# Altium footprint library Generic Footprint.PcbLib: 160 footprints (part 16 of 20) (continued)
## Symbol_FCC-Logo-6x4mm_Silkscreen [mil] (continued)
1(102.68,67.39) 1(102.68,68.46) 1(102.68,68.73) 1(102.68,68.99) 1(102.68,69.26) 1(102.68,69.53) 1(102.68,94.7) 1(102.68,94.96) 1(102.68,95.23) 1(102.68,95.5) 1(102.68,97.11) 1(102.68,97.37) 1(102.68,97.64) 1(102.68,98.18) 1(102.68,98.44) 1(102.68,138.07) 1(102.68,138.33) 1(102.68,138.6) 1(102.95,25.36) 1(102.95,25.89) 1(102.95,26.16) 1(102.95,65.25) 1(102.95,67.39) 1(102.95,67.66) 1(102.95,67.92) 1(102.95,68.19) 1(102.95,95.77) 1(102.95,96.03) 1(102.95,96.3) 1(102.95,96.57) 1(102.95,96.84) 1(102.95,97.11) 1(102.95,97.91) 1(102.95,98.71) 1(102.95,98.98) 1(102.95,137.8) 1(102.95,138.33) 1(103.22,25.09) 1(103.22,25.62) 1(103.22,25.89) 1(103.22,64.18) 1(103.22,64.44) 1(103.22,64.71) 1(103.22,64.98) 1(103.22,65.25) 1(103.22,65.51) 1(103.22,65.78) 1(103.22,66.05) 1(103.22,66.32) 1(103.22,66.59) 1(103.22,66.85) 1(103.22,67.12) 1(103.22,97.37) 1(103.22,97.64) 1(103.22,97.91) 1(103.22,98.18) 1(103.22,98.44) 1(103.22,98.71) 1(103.22,99.25) 1(103.22,99.51) 1(103.22,99.78) 1(103.22,138.07) 1(103.22,138.33) 1(103.22,138.6) 1(103.22,138.87) 1(103.49,25.36) 1(103.49,25.62) 1(103.49,63.64) 1(103.49,63.91) 1(103.49,64.44) 1(103.49,64.71) 1(103.49,64.98) 1(103.49,65.51) 1(103.49,65.78) 1(103.49,66.05) 1(103.49,97.91) 1(103.49,98.18) 1(103.49,98.44) 1(103.49,98.71) 1(103.49,99.25) 1(103.49,99.51) 1(103.49,100.05) 1(103.49,100.32) 1(103.49,100.59) 1(103.49,138.6) 1(103.49,138.87) 1(103.49,139.14) 1(103.75,24.82) 1(103.75,25.09) 1(103.75,25.36) 1(103.75,62.84) 1(103.75,63.11) 1(103.75,63.64) 1(103.75,63.91) 1(103.75,64.44) 1(103.75,64.71) 1(103.75,64.98) 1(103.75,99.25) 1(103.75,99.51) 1(103.75,100.05) 1(103.75,100.32) 1(103.75,100.59) 1(103.75,100.85) 1(103.75,101.12) 1(103.75,101.39) 1(103.75,101.66) 1(103.75,138.87) 1(103.75,139.4) 1(104.02,24.29) 1(104.02,24.55) 1(104.02,24.82) 1(104.02,25.09) 1(104.02,62.84) 1(104.02,63.11) 1(104.02,63.37) 1(104.02,63.64) 1(104.02,63.91) 1(104.02,100.05) 1(104.02,100.32) 1(104.02,100.59) 1(104.02,101.12) 1(104.02,101.39) 1(104.02,101.66) 1(104.02,139.67) 1(104.29,24.02) 1(104.29,24.82) 1(104.29,62.57) 1(104.29,62.84) 1(104.29,101.39) 1(104.29,139.94) 1(104.56,23.75) 1(104.56,24.29) 1(104.56,60.7) 1(104.56,63.11) 1(104.56,101.12) 1(104.56,101.66) 1(104.56,103.53) 1(104.56,140.21) 1(104.83,24.02) 1(104.83,24.29) 1(104.83,59.62) 1(104.83,59.89) 1(104.83,60.16) 1(104.83,60.7) 1(104.83,61.5) 1(104.83,61.77) 1(104.83,62.03) 1(104.83,62.3) 1(104.83,101.92) 1(104.83,102.19) 1(104.83,102.46) 1(104.83,103.53) 1(104.83,104.07) 1(104.83,104.33) 1(104.83,104.6) 1(104.83,140.21) 1(104.83,140.48) 1(105.09,23.48) 1(105.09,23.75) 1(105.09,24.02) 1(105.09,59.09) 1(105.09,59.62) 1(105.09,59.89) 1(105.09,60.16) 1(105.09,60.7) 1(105.09,60.96) 1(105.09,61.23) 1(105.09,102.73) 1(105.09,102.99) 1(105.09,103.26) 1(105.09,103.53) 1(105.09,104.07) 1(105.09,104.33) 1(105.09,104.6) 1(105.09,104.87) 1(105.09,105.14) 1(105.09,140.21) 1(105.09,140.48) 1(105.09,140.74) 1(105.36,22.95) 1(105.36,23.22) 1(105.36,23.48) 1(105.36,23.75) 1(105.36,58.29) 1(105.36,58.55) 1(105.36,58.82) 1(105.36,59.09) 1(105.36,59.62) 1(105.36,60.16) 1(105.36,60.43) 1(105.36,103.8) 1(105.36,104.07) 1(105.36,104.6) 1(105.36,104.87) 1(105.36,105.14) 1(105.36,105.4) 1(105.36,105.67) 1(105.36,140.48) 1(105.36,140.74) 1(105.36,141.01) 1(105.36,141.28) 1(105.63,23.22) 1(105.63,59.09) 1(105.63,59.36) 1(105.63,59.89) 1(105.63,104.33) 1(105.63,104.87) 1(105.63,105.94) 1(105.63,140.74) 1(105.9,22.95) 1(105.9,23.22) 1(105.9,23.48) 1(105.9,57.48) 1(105.9,57.75) 1(105.9,58.02) 1(105.9,58.55) 1(105.9,105.14) 1(105.9,105.67) 1(105.9,106.21) 1(105.9,106.48) 1(105.9,106.74) 1(105.9,141.55) 1(106.16,22.68) 1(106.16,57.22) 1(106.16,57.75) 1(106.16,58.55) 1(106.16,105.67) 1(106.16,106.48) 1(106.16,106.74) 1(106.16,107.01) 1(106.16,107.28) 1(106.16,141.81) 1(106.43,22.41) 1(106.43,22.68) 1(106.43,22.95) 1(106.43,56.68) 1(106.43,57.22) 1(106.43,57.75) 1(106.43,106.48) 1(106.43,106.74) 1(106.43,107.01) 1(106.43,107.28) 1(106.43,107.55) 1(106.7,22.14) 1(106.7,22.41) 1(106.7,22.68) 1(106.7,56.68) 1(106.7,56.95) 1(106.7,57.22) 1(106.7,107.01) 1(106.7,107.28) 1(106.7,107.55) 1(106.7,142.08) 1(106.97,21.88) 1(106.97,22.14) 1(106.97,22.41) 1(106.97,55.34) 1(106.97,56.14) 1(106.97,56.41) 1(106.97,56.68) 1(106.97,107.55) 1(106.97,108.88) 1(106.97,142.35) 1(107.24,21.34) 1(107.24,21.61) 1(107.24,21.88) 1(107.24,55.34) 1(107.24,107.81) 1(107.24,108.08) 1(107.24,108.88) 1(107.24,109.42) 1(107.24,109.69) 1(107.24,142.08) 1(107.24,142.35) 1(107.24,142.62) 1(107.5,21.07) 1(107.5,21.61) 1(107.5,21.88) 1(107.5,22.14) 1(107.5,54.27) 1(107.5,54.54) 1(107.5,55.34) 1(107.5,55.61) 1(107.5,55.88) 1(107.5,108.35) 1(107.5,108.62) 1(107.5,108.88) 1(107.5,109.42) 1(107.5,109.96) 1(107.5,110.22) 1(107.5,142.08) 1(107.5,142.35) 1(107.5,142.62) 1(107.5,142.88) 1(107.77,21.34) 1(107.77,21.61) 1(107.77,53.73) 1(107.77,54) 1(107.77,54.27) 1(107.77,54.54) 1(107.77,54.81) 1(107.77,55.07) 1(107.77,109.15) 1(107.77,109.42) 1(107.77,109.69) 1(107.77,109.96) 1(107.77,110.22) 1(107.77,110.49) 1(107.77,142.62) 1(107.77,142.88) 1(107.77,143.15) 1(108.04,20.81) 1(108.04,21.07) 1(108.04,21.34) 1(108.04,52.93) 1(108.04,53.2) 1(108.04,53.47) 1(108.04,53.73) 1(108.04,54) 1(108.04,54.27) 1(108.04,109.69) 1(108.04,109.96) 1(108.04,110.22) 1(108.04,110.49) 1(108.04,110.76) 1(108.04,111.03) 1(108.04,142.88) 1(108.04,143.42) 1(108.31,54) 1(108.31,54.54) 1(108.31,110.49) 1(108.31,110.76) 1(108.31,111.29) 1(108.31,143.15) 1(108.31,143.69) 1(108.57,20.54) 1(108.57,21.07) 1(108.57,52.4) 1(108.57,52.66) 1(108.57,53.2) 1(108.57,53.73) 1(108.57,110.76) 1(108.57,111.03) 1(108.57,111.56) 1(108.57,111.83) 1(108.57,143.15) 1(108.57,143.96) 1(108.84,20.27) 1(108.84,20.54) 1(108.84,20.81) 1(108.84,52.4) 1(108.84,53.2) 1(108.84,111.03) 1(108.84,111.56) 1(108.84,111.83) 1(108.84,112.1) 1(108.84,112.36) 1(109.11,20) 1(109.11,20.27) 1(109.11,20.81) 1(109.11,51.59) 1(109.11,52.4) 1(109.11,111.56) 1(109.11,111.83) 1(109.11,112.1) 1(109.11,112.36) 1(109.11,144.22) 1(109.38,19.73) 1(109.38,20) 1(109.38,20.27) 1(109.38,20.54) 1(109.38,51.59) 1(109.38,52.13) 1(109.38,112.1) 1(109.38,112.36) 1(109.38,144.22) 1(109.38,144.49) 1(109.64,19.47) 1(109.64,19.73) 1(109.64,50.52) 1(109.64,50.79) 1(109.64,51.86) 1(109.64,144.49) 1(109.64,144.76) 1(109.91,19.2) 1(109.91,20) 1(109.91,50.25) 1(109.91,50.79) 1(109.91,51.33) 1(109.91,51.59) 1(109.91,112.63) 1(109.91,112.9) 1(109.91,113.44) 1(109.91,113.7) 1(109.91,113.97) 1(109.91,144.22) 1(110.18,19.73) 1(110.18,49.72) 1(110.18,49.99) 1(110.18,50.25) 1(110.18,50.52) 1(110.18,50.79) 1(110.18,51.06) 1(110.18,113.17) 1(110.18,113.7) 1(110.18,113.97) 1(110.18,114.24) 1(110.18,114.51) 1(110.18,114.77) 1(110.45,18.66) 1(110.45,18.93) 1(110.45,19.2) 1(110.45,19.47) 1(110.45,49.18) 1(110.45,49.45) 1(110.45,49.72) 1(110.45,50.25) 1(110.45,50.52) 1(110.45,113.7) 1(110.45,113.97) 1(110.45,114.24) 1(110.45,114.51) 1(110.45,115.04) 1(110.45,144.49) 1(110.45,144.76) 1(110.45,145.29) 1(110.72,18.93) 1(110.72,19.2) 1(110.72,19.47) 1(110.72,48.92) 1(110.72,49.45) 1(110.72,49.72) 1(110.72,114.24) 1(110.72,114.51) 1(110.72,115.04) 1(110.72,115.31) 1(110.72,144.76) 1(110.72,145.03) 1(110.72,145.29) 1(110.72,145.56) 1(110.98,18.4) 1(110.98,18.66) 1(110.98,145.56) 1(110.98,145.83) 1(111.25,18.93) 1(111.25,48.92) 1(111.25,49.45) 1(111.25,115.04) 1(111.25,115.31) 1(111.25,145.29) 1(111.25,146.1) 1(111.52,18.13) 1(111.52,18.66) 1(111.52,48.92) 1(111.52,78.36) 1(111.52,78.63) 1(111.52,78.9) 1(111.52,79.17) 1(111.52,79.44) 1(111.52,79.7) 1(111.52,79.97) 1(111.52,80.24) 1(111.52,80.51) 1(111.52,80.77) 1(111.52,81.04) 1(111.52,81.31) 1(111.52,81.58) 1(111.52,81.85) 1(111.52,82.11) 1(111.52,82.38) 1(111.52,82.65) 1(111.52,82.92) 1(111.52,83.18) 1(111.52,83.45) 1(111.52,83.72) 1(111.52,83.99) 1(111.52,84.25) 1(111.52,84.52) 1(111.52,84.79) 1(111.52,85.06) 1(111.52,85.33) 1(111.52,85.59) 1(111.52,85.86) 1(111.52,115.31) 1(111.52,115.58) 1(111.52,115.85) 1(111.52,116.38) 1(111.52,145.56) 1(111.52,145.83) 1(111.79,17.86) 1(111.79,18.13) 1(111.79,18.4) 1(111.79,47.58) 1(111.79,48.11) 1(111.79,48.38) 1(111.79,48.65) 1(111.79,75.69) 1(111.79,75.96) 1(111.79,76.22) 1(111.79,76.49) 1(111.79,76.76) 1(111.79,77.03) 1(111.79,77.29) 1(111.79,77.56) 1(111.79,78.36) 1(111.79,78.63) 1(111.79,78.9) 1(111.79,79.17) 1(111.79,79.44) 1(111.79,79.7) 1(111.79,79.97) 1(111.79,80.24) 1(111.79,80.51) 1(111.79,80.77) 1(111.79,81.04) 1(111.79,81.31) 1(111.79,81.58) 1(111.79,81.85) 1(111.79,82.11) 1(111.79,82.38) 1(111.79,82.65) 1(111.79,82.92) 1(111.79,83.18) 1(111.79,83.45) 1(111.79,83.72) 1(111.79,83.99) 1(111.79,84.25) 1(111.79,84.52) 1(111.79,84.79) 1(111.79,85.06) 1(111.79,85.33) 1(111.79,85.59) 1(111.79,85.86) 1(111.79,86.66) 1(111.79,86.93) 1(111.79,87.2) 1(111.79,87.47) 1(111.79,87.74) 1(111.79,88) 1(111.79,88.27) 1(111.79,88.54) 1(111.79,116.38) 1(111.79,116.65) 1(111.79,145.83) 1(111.79,146.36) 1(112.05,17.33) 1(112.05,17.59) 1(112.05,17.86) 1(112.05,18.4) 1(112.05,47.58) 1(112.05,73.81) 1(112.05,74.08) 1(112.05,74.35) 1(112.05,74.62) 1(112.05,74.88) 1(112.05,75.69) 1(112.05,75.96) 1(112.05,76.22) 1(112.05,76.49) 1(112.05,76.76) 1(112.05,77.03) 1(112.05,77.29) 1(112.05,77.56) 1(112.05,78.1) 1(112.05,78.36) 1(112.05,78.63) 1(112.05,78.9) 1(112.05,79.17) 1(112.05,79.44) 1(112.05,79.7) 1(112.05,79.97) 1(112.05,80.24) 1(112.05,80.51) 1(112.05,80.77) 1(112.05,81.04) 1(112.05,81.31) 1(112.05,81.58) 1(112.05,81.85) 1(112.05,82.11) 1(112.05,82.38) 1(112.05,82.65) 1(112.05,82.92) 1(112.05,83.18) 1(112.05,83.45) 1(112.05,83.72) 1(112.05,83.99) 1(112.05,84.25) 1(112.05,84.52) 1(112.05,84.79) 1(112.05,85.06) 1(112.05,85.33) 1(112.05,85.59) 1(112.05,85.86) 1(112.05,86.13) 1(112.05,86.66) 1(112.05,86.93) 1(112.05,87.2) 1(112.05,87.47) 1(112.05,87.74) 1(112.05,88) 1(112.05,88.27) 1(112.05,88.54) 1(112.05,89.07) 1(112.05,89.34) 1(112.05,89.61) 1(112.05,89.88) 1(112.05,90.14) 1(112.05,90.41) 1(112.05,116.11) 1(112.05,116.65) 1(112.05,117.18) 1(112.05,146.63) 1(112.32,18.13) 1(112.32,47.04) 1(112.32,47.31) 1(112.32,47.58) 1(112.32,47.85) 1(112.32,72.21) 1(112.32,72.48) 1(112.32,72.74) 1(112.32,73.01) 1(112.32,73.28) 1(112.32,73.55) 1(112.32,73.81) 1(112.32,75.15) 1(112.32,77.83) 1(112.32,90.41) 1(112.32,90.68) 1(112.32,90.95) 1(112.32,91.22) 1(112.32,91.48) 1(112.32,91.75) 1(112.32,116.38) 1(112.32,116.65) 1(112.32,117.45) 1(112.32,146.63) 1(112.32,146.9) 1(112.59,17.86) 1(112.59,46.24) 1(112.59,46.51) 1(112.59,70.87) 1(112.59,71.14) 1(112.59,71.4) 1(112.59,71.67) 1(112.59,71.94) 1(112.59,74.08) 1(112.59,74.35) 1(112.59,74.62) 1(112.59,74.88) 1(112.59,75.15) 1(112.59,75.42) 1(112.59,75.69) 1(112.59,75.96) 1(112.59,76.22) 1(112.59,76.49) 1(112.59,76.76) 1(112.59,77.03) 1(112.59,77.29) 1(112.59,77.56) 1(112.59,86.4) 1(112.59,86.66) 1(112.59,86.93) 1(112.59,87.2) 1(112.59,87.47) 1(112.59,87.74) 1(112.59,88) 1(112.59,88.27) 1(112.59,88.54) 1(112.59,88.81) 1(112.59,89.07) 1(112.59,89.34) 1(112.59,89.61) 1(112.59,89.88) 1(112.59,90.14) 1(112.59,92.02) 1(112.59,92.29) 1(112.59,92.55) 1(112.59,92.82) 1(112.59,93.09) 1(112.59,93.36) 1(112.59,116.92) 1(112.59,117.18) 1(112.59,117.45) 1(112.59,117.72) 1(112.59,117.99) 1(112.59,147.17) 1(112.86,17.06) 1(112.86,45.97) 1(112.86,46.24) 1(112.86,46.51) 1(112.86,46.77) 1(112.86,69.8) 1(112.86,70.07) 1(112.86,70.33) 1(112.86,70.6) 1(112.86,72.48) 1(112.86,73.01) 1(112.86,73.81) 1(112.86,74.08) 1(112.86,74.35) 1(112.86,74.62) 1(112.86,74.88) 1(112.86,75.15) 1(112.86,89.07) 1(112.86,89.34) 1(112.86,89.61) 1(112.86,89.88) 1(112.86,90.14) 1(112.86,90.41) 1(112.86,91.22) 1(112.86,91.75) 1(112.86,93.62) 1(112.86,93.89) 1(112.86,94.16) 1(112.86,94.43) 1(112.86,117.18) 1(112.86,117.45) 1(112.86,117.99) 1(112.86,118.25) 1(113.12,16.79) 1(113.12,45.44) 1(113.12,45.7) 1(113.12,46.24) 1(113.12,46.51) 1(113.12,68.99) 1(113.12,69.26) 1(113.12,69.53) 1(113.12,69.8) 1(113.12,70.07) 1(113.12,72.48) 1(113.12,73.01) 1(113.12,91.22) 1(113.12,91.75) 1(113.12,93.89) 1(113.12,94.43) 1(113.12,94.7) 1(113.12,94.96) 1(113.12,95.23) 1(113.12,118.25) 1(113.12,118.52) 1(113.12,146.63) 1(113.12,146.9) 1(113.12,147.44) 1(113.39,16.52) 1(113.39,17.06) 1(113.39,45.7) 1(113.39,67.92) 1(113.39,68.99) 1(113.39,69.8) 1(113.39,70.07) 1(113.39,93.89) 1(113.39,94.43) 1(113.39,94.7) 1(113.39,94.96) 1(113.39,95.23) 1(113.39,95.5) 1(113.39,96.3) 1(113.39,117.99) 1(113.39,118.52) 1(113.39,118.79) 1(113.39,146.9) 1(113.39,147.17) 1(113.39,147.7) 1(113.66,45.17) 1(113.66,45.44) 1(113.66,45.7) 1(113.66,67.66) 1(113.66,68.19) 1(113.66,68.46) 1(113.66,95.5) 1(113.66,95.77) 1(113.66,96.03) 1(113.66,118.25) 1(113.66,118.79) 1(113.66,147.17) 1(113.66,147.44) 1(113.66,147.97) 1(113.93,16.25) 1(113.93,17.06) 1(113.93,45.17) 1(113.93,45.44) 1(113.93,66.85) 1(113.93,67.12) 1(113.93,67.39) 1(113.93,67.66) 1(113.93,67.92) 1(113.93,68.19) 1(113.93,68.46) 1(113.93,68.73) 1(113.93,68.99) 1(113.93,94.7) 1(113.93,94.96) 1(113.93,95.23) 1(113.93,95.5) 1(113.93,95.77) 1(113.93,96.03) 1(113.93,96.3) 1(113.93,96.84) 1(113.93,97.11) 1(113.93,97.37) 1(113.93,118.52) 1(114.2,15.99) 1(114.2,16.25) 1(114.2,16.52) 1(114.2,44.1) 1(114.2,44.36) 1(114.2,45.17) 1(114.2,65.51) 1(114.2,65.78) 1(114.2,66.05) 1(114.2,66.32) 1(114.2,66.85) 1(114.2,67.12) 1(114.2,67.66) 1(114.2,67.92) 1(114.2,68.19) 1(114.2,68.46) 1(114.2,95.77) 1(114.2,96.03) 1(114.2,96.3) 1(114.2,96.57) 1(114.2,96.84) 1(114.2,97.11) 1(114.2,97.37) 1(114.2,97.91) 1(114.2,98.18) 1(114.2,98.44) 1(114.2,118.79) 1(114.2,119.06) 1(114.2,119.86) 1(114.2,147.44) 1(114.2,148.24) 1(114.46,43.83) 1(114.46,44.36) 1(114.46,44.63) 1(114.46,44.9) 1(114.46,64.44) 1(114.46,65.25) 1(114.46,65.51) 1(114.46,65.78) 1(114.46,66.05) 1(114.46,66.32) 1(114.46,66.85) 1(114.46,67.12) 1(114.46,96.84) 1(114.46,97.11) 1(114.46,97.37) 1(114.46,97.91) 1(114.46,98.18) 1(114.46,98.44) 1(114.46,98.71) 1(114.46,98.98) 1(114.46,99.51) 1(114.46,99.78) 1(114.46,119.33) 1(114.46,119.86) 1(114.46,120.13) 1(114.46,120.4) 1(114.46,148.51) 1(114.73,15.72) 1(114.73,15.99) 1(114.73,16.25) 1(114.73,16.52) 1(114.73,43.56) 1(114.73,44.1) 1(114.73,44.36) 1(114.73,63.64) 1(114.73,64.71) 1(114.73,64.98) 1(114.73,65.25) 1(114.73,65.78) 1(114.73,66.05) 1(114.73,66.32) 1(114.73,66.59) 1(114.73,97.64) 1(114.73,97.91) 1(114.73,98.18) 1(114.73,98.44) 1(114.73,98.71) 1(114.73,98.98) 1(114.73,119.59) 1(114.73,120.13) 1(114.73,148.24) 1(115,15.45) 1(115,43.29) 1(115,43.83) 1(115,63.91) 1(115,64.18) 1(115,100.05) 1(115,100.32) 1(115,100.59) 1(115,119.86) 1(115,120.4) 1(115,120.66) 1(115,120.93) 1(115,148.77) 1(115.27,15.18) 1(115.27,15.72) 1(115.27,15.99) 1(115.27,43.03) 1(115.27,43.29) 1(115.27,43.56) 1(115.27,43.83) 1(115.27,44.1) 1(115.27,62.84) 1(115.27,63.11) 1(115.27,63.37) 1(115.27,65.25) 1(115.27,65.51) 1(115.27,98.71) 1(115.27,98.98) 1(115.27,99.25) 1(115.27,100.85) 1(115.27,101.12) 1(115.27,120.13) 1(115.27,120.4) 1(115.27,120.93) 1(115.27,148.24) 1(115.53,14.92) 1(115.53,15.45) 1(115.53,15.72) 1(115.53,42.49) 1(115.53,43.29) 1(115.53,43.56) 1(115.53,62.57) 1(115.53,63.11) 1(115.53,101.12) 1(115.53,101.39) 1(115.53,101.66) 1(115.53,120.93) 1(115.53,121.47) 1(115.53,121.74) 1(115.53,149.04) 1(115.8,15.45) 1(115.8,42.22) 1(115.8,61.5) 1(115.8,61.77) 1(115.8,62.03) 1(115.8,62.57) 1(115.8,63.11) 1(115.8,101.12) 1(115.8,101.66) 1(115.8,102.19) 1(115.8,102.46) 1(115.8,102.73) 1(115.8,121.2) 1(115.8,121.47) 1(116.07,14.65) 1(116.07,42.49) 1(116.07,42.76) 1(116.07,60.96) 1(116.07,61.5) 1(116.07,61.77) 1(116.07,62.03) 1(116.07,62.3) 1(116.07,62.57) 1(116.07,101.66) 1(116.07,101.92) 1(116.07,102.19) 1(116.07,102.46) 1(116.07,102.73) 1(116.07,102.99) 1(116.07,121.74) 1(116.07,149.04) 1(116.07,149.31) 1(116.07,149.58) 1(116.34,14.38) 1(116.34,42.22) 1(116.34,61.23) 1(116.34,62.03) 1(116.34,102.73) 1(116.34,121.47) 1(116.34,149.31) 1(116.61,41.69) 1(116.61,42.49) 1(116.61,59.89) 1(116.61,60.43) 1(116.61,60.96) 1(116.61,61.23) 1(116.61,61.5) 1(116.61,61.77) 1(116.61,102.19) 1(116.61,102.46) 1(116.61,102.99) 1(116.61,103.53) 1(116.61,103.8) 1(116.61,104.33) 1(116.61,121.74) 1(116.61,122.54) 1(116.61,149.04) 1(116.61,149.58) 1(116.61,149.85) 1(116.87,14.65) 1(116.87,41.15) 1(116.87,41.42) 1(116.87,41.69) 1(116.87,41.96) 1(116.87,42.22) 1(116.87,59.09) 1(116.87,59.36) 1(116.87,59.62) 1(116.87,60.43) 1(116.87,60.7) 1(116.87,60.96) 1(116.87,61.23) 1(116.87,102.99) 1(116.87,103.26) 1(116.87,103.8) 1(116.87,104.6) 1(116.87,104.87) 1(116.87,122) 1(116.87,122.27) 1(116.87,122.54) 1(116.87,122.81) 1(116.87,149.31) 1(117.14,14.11) 1(117.14,40.88) 1(117.14,41.42) 1(117.14,41.69) 1(117.14,58.82) 1(117.14,59.62) 1(117.14,59.89) 1(117.14,60.43) 1(117.14,103.8) 1(117.14,104.33) 1(117.14,104.6) 1(117.14,105.14) 1(117.14,105.4) 1(117.14,122.81) 1(117.14,123.07) 1(117.14,123.34) 1(117.14,149.58) 1(117.14,149.85) 1(117.14,150.11) 1(117.41,14.38) 1(117.41,14.65) 1(117.41,40.62) 1(117.41,41.15) 1(117.41,41.42) 1(117.41,58.55) 1(117.41,59.09) 1(117.41,59.62) 1(117.41,59.89) 1(117.41,60.16) 1(117.41,104.07) 1(117.41,104.33) 1(117.41,104.6) 1(117.41,105.67) 1(117.41,122.54) 1(117.41,123.07) 1(117.68,13.85) 1(117.68,14.11) 1(117.68,14.38) 1(117.68,40.35) 1(117.68,40.88) 1(117.68,41.15) 1(117.68,58.29) 1(117.68,59.09) 1(117.68,105.4) 1(117.68,122.81) 1(117.68,123.34) 1(117.68,123.61) 1(117.68,149.85) 1(117.68,150.11) 1(117.68,150.38) 1(117.94,13.58) 1(117.94,40.08) 1(117.94,40.62) 1(117.94,40.88) 1(117.94,57.75) 1(117.94,58.02) 1(117.94,58.29) 1(117.94,58.55) 1(117.94,105.4) 1(117.94,105.94) 1(117.94,106.21) 1(117.94,106.48) 1(117.94,123.07) 1(117.94,123.61) 1(117.94,123.88) 1(117.94,150.11) 1(117.94,150.65) 1(118.21,14.11) 1(118.21,39.81) 1(118.21,40.08) 1(118.21,40.35) 1(118.21,40.62) 1(118.21,57.22) 1(118.21,57.75) 1(118.21,58.29) 1(118.21,58.55) 1(118.21,106.21) 1(118.21,106.48) 1(118.21,107.01) 1(118.21,123.34) 1(118.21,123.61) 1(118.21,123.88) 1(118.21,150.92) 1(118.48,13.04) 1(118.48,13.31) 1(118.48,13.58) 1(118.48,40.35) 1(118.48,57.22) 1(118.48,57.48) 1(118.48,57.75) 1(118.48,106.21) 1(118.48,106.48) 1(118.48,107.01) 1(118.48,107.55) 1(118.48,107.81) 1(118.48,123.88) 1(118.75,13.31) 1(118.75,13.58) 1(118.75,39.81) 1(118.75,40.08) 1(118.75,56.41) 1(118.75,57.22) 1(118.75,106.74) 1(118.75,107.01) 1(118.75,107.55) 1(118.75,124.68) 1(118.75,151.18) 1(119.01,12.77) 1(119.01,39.28) 1(119.01,55.61) 1(119.01,55.88) 1(119.01,56.95) 1(119.01,107.28) 1(119.01,107.81) 1(119.01,108.35) 1(119.01,108.62) 1(119.01,124.14) 1(119.01,124.68) 1(119.01,124.95) 1(119.28,13.04) 1(119.28,13.31) 1(119.28,38.74) 1(119.28,39.01) 1(119.28,39.28) 1(119.28,39.81) 1(119.28,55.88) 1(119.28,56.41) 1(119.28,56.68) 1(119.28,107.55) 1(119.28,107.81) 1(119.28,108.08) 1(119.28,124.41) 1(119.28,125.22) 1(119.28,151.45) 1(119.55,13.04) 1(119.55,38.48) 1(119.55,39.01) 1(119.55,39.28) 1(119.55,39.55) 1(119.55,54.81) 1(119.55,55.07) 1(119.55,55.61) 1(119.55,56.14) 1(119.55,56.41) 1(119.55,108.35) 1(119.55,108.62) 1(119.55,108.88) 1(119.55,109.15) 1(119.55,109.42) 1(119.55,124.68) 1(119.55,124.95) 1(119.55,125.22) 1(119.55,125.48) 1(119.55,151.18) 1(119.55,151.72) 1(119.82,12.24) 1(119.82,12.51) 1(119.82,38.21) 1(119.82,38.74) 1(119.82,39.01) 1(119.82,54.54) 1(119.82,55.34) 1(119.82,55.61) 1(119.82,55.88) 1(119.82,108.35) 1(119.82,108.62) 1(119.82,109.69) 1(119.82,124.95) 1(119.82,125.22) 1(119.82,125.48) 1(119.82,125.75) 1(119.82,126.02) 1(119.82,151.18) 1(120.09,37.94) 1(120.09,38.48) 1(120.09,38.74) 1(120.09,54) 1(120.09,54.27) 1(120.09,109.96) 1(120.09,125.75) 1(120.09,151.45) 1(120.09,151.72) 1(120.09,151.99) 1(120.35,11.97) 1(120.35,38.21) 1(120.35,38.48) 1(120.35,53.73) 1(120.35,110.22) 1(120.35,110.49) 1(120.35,125.48) 1(120.35,126.02) 1(120.35,126.29) 1(120.62,37.94) 1(120.62,38.21) 1(120.62,53.47) 1(120.62,54) 1(120.62,54.27) 1(120.62,109.96) 1(120.62,110.22) 1(120.62,110.76) 1(120.62,125.75) 1(120.62,126.29) 1(120.62,151.45) 1(120.62,151.99) 1(120.62,152.25) 1(120.89,11.7) 1(120.89,12.24) 1(120.89,37.14) 1(120.89,37.4) 1(120.89,37.94) 1(120.89,53.73) 1(120.89,54) 1(120.89,54.27) 1(120.89,109.96) 1(120.89,110.22) 1(120.89,110.49) 1(120.89,126.02) 1(120.89,126.29) 1(120.89,151.72) 1(121.16,11.97) 1(121.16,12.24) 1(121.16,37.14) 1(121.16,37.4) 1(121.16,37.67) 1(121.16,52.4) 1(121.16,52.66) 1(121.16,53.47) 1(121.16,53.73) 1(121.16,110.49) 1(121.16,110.76) 1(121.16,111.29) 1(121.16,111.56) 1(121.16,126.55) 1(121.16,127.09) 1(121.16,151.99) 1(121.16,152.52) 1(121.42,37.4) 1(121.42,52.13) 1(121.42,52.66) 1(121.42,53.2) 1(121.42,53.47) 1(121.42,110.76) 1(121.42,111.03) 1(121.42,111.29) 1(121.42,111.56) 1(121.42,111.83) 1(121.42,127.09) 1(121.42,127.36) 1(121.42,152.79) 1(121.69,11.44) 1(121.69,11.7) 1(121.69,11.97) 1(121.69,52.93) 1(121.69,111.29) 1(121.69,112.1) 1(121.69,126.82) 1(121.69,127.36) 1(121.69,152.52) 1(121.96,36.33) 1(121.96,36.6) 1(121.96,37.14) 1(121.96,51.59) 1(121.96,51.86) 1(121.96,52.66) 1(121.96,111.56) 1(121.96,112.36) 1(121.96,112.63) 1(121.96,127.09) 1(121.96,153.06) 1(122.23,36.07) 1(122.23,36.6) 1(122.23,51.33) 1(122.23,51.86) 1(122.23,112.36) 1(122.23,112.9) 1(122.23,127.36) 1(122.23,127.89) 1(122.23,128.16) 1(122.23,152.52) 1(122.23,152.79) 1(122.23,153.33) 1(122.49,10.9) 1(122.49,11.17) 1(122.49,11.44) 1(122.49,11.7) 1(122.49,35.8) 1(122.49,36.33) 1(122.49,36.6) 1(122.49,36.87) 1(122.49,51.06) 1(122.49,51.33) 1(122.49,51.59) 1(122.49,51.86) 1(122.49,112.36) 1(122.49,112.63) 1(122.49,112.9) 1(122.49,113.17) 1(122.49,127.62) 1(122.49,127.89) 1(122.49,152.79) 1(122.76,10.63) 1(122.76,10.9) 1(122.76,11.17) 1(122.76,11.44) 1(122.76,35.53) 1(122.76,36.07) 1(122.76,36.33) 1(122.76,50.79) 1(122.76,51.06) 1(122.76,51.59) 1(122.76,112.63) 1(122.76,112.9) 1(122.76,113.17) 1(122.76,113.44) 1(122.76,127.89) 1(122.76,128.16) 1(122.76,128.43) 1(122.76,153.59) 1(123.03,10.9) 1(123.03,11.17) 1(123.03,35.8) 1(123.03,36.07) 1(123.03,50.52) 1(123.03,50.79) 1(123.03,51.33) 1(123.03,128.43) 1(123.03,128.7) 1(123.3,10.36) 1(123.3,35.53) 1(123.3,35.8) 1(123.3,50.52) 1(123.3,51.06) 1(123.3,113.17) 1(123.3,113.44) 1(123.3,113.97) 1(123.3,114.24) 1(123.3,128.16) 1(123.3,128.7) 1(123.57,34.99) 1(123.57,35.26) 1(123.57,49.45) 1(123.57,49.72) 1(123.57,49.99) 1(123.57,50.79) 1(123.57,113.44) 1(123.57,113.97) 1(123.57,114.24) 1(123.57,114.51) 1(123.57,128.43) 1(123.57,153.33) 1(123.57,153.86) 1(123.83,10.1) 1(123.83,35.26) 1(123.83,49.18) 1(123.83,49.72) 1(123.83,49.99) 1(123.83,50.25) 1(123.83,50.52) 1(123.83,113.7) 1(123.83,113.97) 1(123.83,114.24) 1(123.83,114.51) 1(123.83,114.77) 1(123.83,129.23) 1(123.83,153.33) 1(123.83,153.59) 1(124.1,34.99) 1(124.1,35.26) 1(124.1,35.53) 1(124.1,49.45) 1(124.1,49.72) 1(124.1,49.99) 1(124.1,114.51) 1(124.1,114.77) 1(124.1,115.04) 1(124.1,128.7) 1(124.1,129.23) 1(124.1,154.13) 1(124.37,9.83) 1(124.37,34.99) 1(124.37,48.92) 1(124.37,49.18) 1(124.37,115.31) 1(124.37,128.96) 1(124.37,129.77) 1(124.37,153.59) 1(124.37,153.86) 1(124.64,34.73) 1(124.64,48.65) 1(124.64,49.45) 1(124.64,114.77) 1(124.64,115.04) 1(124.64,115.58) 1(124.64,129.23) 1(124.64,129.77) 1(124.9,34.19) 1(124.9,48.38) 1(124.9,48.65) 1(124.9,48.92) 1(124.9,49.18) 1(124.9,115.04) 1(124.9,115.31) 1(124.9,115.85) 1(124.9,129.5) 1(124.9,130.03) 1(124.9,153.86) 1(124.9,154.4) 1(125.17,9.56) 1(125.17,10.1) 1(125.17,33.92) 1(125.17,34.19) 1(125.17,48.11) 1(125.17,48.38) 1(125.17,48.92) 1(125.17,115.31) 1(125.17,115.85) 1(125.17,116.11) 1(125.17,130.3) 1(125.17,154.13) 1(125.17,154.4) 1(125.17,154.66) 1(125.44,9.29) 1(125.44,10.1) 1(125.44,33.66) 1(125.44,33.92) 1(125.44,34.46) 1(125.44,47.85) 1(125.44,48.11) 1(125.44,48.38) 1(125.44,48.65) 1(125.44,115.85) 1(125.44,116.11) 1(125.44,116.38) 1(125.44,129.77) 1(125.44,130.03) 1(125.44,130.3) 1(125.44,154.13) 1(125.44,154.4) 1(125.71,9.56) 1(125.71,9.83) 1(125.71,33.39) 1(125.71,33.66) 1(125.71,33.92) 1(125.71,34.19) 1(125.71,47.58) 1(125.71,116.65) 1(125.71,130.03) 1(125.71,130.84) 1(125.71,154.4) 1(125.71,154.66) 1(125.71,154.93) 1(125.98,9.83) 1(125.98,33.12) 1(125.98,33.39) 1(125.98,33.66) 1(125.98,47.31) 1(125.98,47.85) 1(125.98,48.11) 1(125.98,116.11) 1(125.98,116.38) 1(125.98,116.92) 1(125.98,130.3) 1(125.98,130.84) 1(125.98,154.4) 1(126.24,9.03) 1(126.24,9.29) 1(126.24,9.56) 1(126.24,46.77) 1(126.24,47.04) 1(126.24,47.85) 1(126.24,116.38) 1(126.24,116.65) 1(126.24,116.92) 1(126.24,117.18) 1(126.24,154.66) 1(126.24,154.93) 1(126.24,155.2) 1(126.51,33.12) 1(126.51,46.51) 1(126.51,47.04) 1(126.51,116.65) 1(126.51,117.18) 1(126.51,117.45) 1(126.51,130.57) 1(126.78,33.39) 1(126.78,46.77) 1(126.78,47.04) 1(126.78,116.92) 1(126.78,117.18) 1(126.78,117.45) 1(126.78,117.72) 1(126.78,130.84) 1(126.78,154.93) 1(126.78,155.2) 1(126.78,155.47) 1(127.05,8.76) 1(127.05,9.03) 1(127.05,9.29) 1(127.05,46.24) 1(127.05,46.51) 1(127.05,117.99) 1(127.05,131.37) 1(127.31,33.12) 1(127.31,45.97) 1(127.31,46.24) 1(127.31,46.77) 1(127.31,117.45) 1(127.31,117.72) 1(127.31,118.25) 1(127.31,131.11) 1(127.31,131.37) 1(127.31,131.64) 1(127.31,155.2) 1(127.31,155.74) 1(127.58,8.49) 1(127.58,9.03) 1(127.58,32.85) 1(127.58,45.7) 1(127.58,45.97) 1(127.58,46.51) 1(127.58,117.72) 1(127.58,117.99) 1(127.58,118.52) 1(127.58,131.37) 1(127.58,131.64) 1(127.58,132.18) 1(127.85,8.76) 1(127.85,32.59) 1(127.85,45.44) 1(127.85,45.7) 1(127.85,46.24) 1(127.85,117.99) 1(127.85,118.52) 1(127.85,118.79) 1(127.85,131.64) 1(128.12,8.22) 1(128.12,8.76) 1(128.12,31.78) 1(128.12,45.17) 1(128.12,45.44) 1(128.12,45.7) 1(128.12,45.97) 1(128.12,118.52) 1(128.12,118.79) 1(128.12,119.06) 1(128.12,132.18) 1(128.12,132.44) 1(128.12,156) 1(128.38,7.96) 1(128.38,32.32) 1(128.38,44.9) 1(128.38,119.33) 1(128.38,131.91) 1(128.65,31.51) 1(128.65,31.78) 1(128.65,32.05) 1(128.65,45.17) 1(128.65,45.44) 1(128.65,118.79) 1(128.65,119.06) 1(128.65,132.18) 1(128.65,132.44) 1(128.65,132.71) 1(128.65,156.27) 1(128.92,7.69) 1(128.92,31.25) 1(128.92,44.36) 1(128.92,44.63) 1(128.92,44.9) 1(128.92,156) 1(129.19,31.25) 1(129.19,31.51) 1(129.19,31.78) 1(129.19,44.9) 1(129.19,45.17) 1(129.19,119.06) 1(129.19,119.33) 1(129.19,119.86) 1(129.19,132.44) 1(129.19,132.71) 1(129.19,156) 1(129.46,30.71) 1(129.46,31.51) 1(129.46,44.1) 1(129.46,44.36) 1(129.46,119.33) 1(129.46,119.59) 1(129.46,119.86) 1(129.46,120.13) 1(129.46,156.27) 1(129.46,156.54) 1(129.72,7.96) 1(129.72,43.83) 1(129.72,44.1) 1(129.72,120.4) 1(129.72,132.71) 1(129.99,7.42) 1(129.99,7.96) 1(129.99,30.71) 1(129.99,31.25) 1(129.99,44.36) 1(129.99,119.86) 1(129.99,120.13) 1(129.99,120.66) 1(129.99,132.98) 1(130.26,7.69) 1(130.26,30.44) 1(130.26,43.56) 1(130.26,44.1) 1(130.26,120.13) 1(130.26,120.4) 1(130.26,156.27) 1(130.26,156.54) 1(130.26,156.81) 1(130.53,30.98) 1(130.53,43.29) 1(130.53,43.83) 1(130.53,120.4) 1(130.53,120.93) 1(130.53,133.25) 1(130.53,133.78) 1(130.79,30.44) 1(130.79,42.76) 1(130.79,43.03) 1(130.79,43.29) 1(130.79,43.56) 1(130.79,43.83) 1(130.79,121.2) 1(130.79,133.78) 1(130.79,134.05) 1(130.79,156.54) 1(130.79,156.81) 1(130.79,157.07) 1(131.06,7.15) 1(131.06,7.69) 1(131.06,30.71) 1(131.06,43.56) 1(131.06,121.47) 1(131.06,133.51) 1(131.33,6.88) 1(131.33,7.42) 1(131.33,30.44) 1(131.33,42.49) 1(131.33,43.29) 1(131.33,121.2) 1(131.33,134.05) 1(131.33,157.34) 1(131.6,6.88) 1(131.6,7.42) 1(131.6,79.17) 1(131.6,79.44) 1(131.6,79.7) 1(131.6,79.97) 1(131.6,80.24) 1(131.6,80.51) 1(131.6,80.77) 1(131.6,81.04) 1(131.6,81.31) 1(131.6,81.58) 1(131.6,81.85) 1(131.6,82.11) 1(131.6,82.38) 1(131.6,82.65) 1(131.6,82.92) 1(131.6,83.18) 1(131.6,83.45) 1(131.6,83.72) 1(131.6,83.99) 1(131.6,84.25) 1(131.6,84.52) 1(131.6,84.79) 1(131.6,121.74) 1(131.6,133.78) 1(131.6,134.32) 1(131.6,134.59) 1(131.87,6.62) 1(131.87,7.15) 1(131.87,30.18) 1(131.87,42.22) 1(131.87,42.49) 1(131.87,42.76) 1(131.87,77.29) 1(131.87,77.56) 1(131.87,77.83) 1(131.87,78.1) 1(131.87,78.36) 1(131.87,78.63) 1(131.87,78.9) 1(131.87,79.44) 1(131.87,79.7) 1(131.87,79.97) 1(131.87,80.24) 1(131.87,80.51) 1(131.87,80.77) 1(131.87,81.04) 1(131.87,81.31) 1(131.87,81.58) 1(131.87,81.85) 1(131.87,82.11) 1(131.87,82.38) 1(131.87,82.65) 1(131.87,82.92) 1(131.87,83.18) 1(131.87,83.45) 1(131.87,83.72) 1(131.87,83.99) 1(131.87,84.25) 1(131.87,84.52) 1(131.87,84.79) 1(131.87,85.06) 1(131.87,85.33) 1(131.87,85.59) 1(131.87,85.86) 1(131.87,86.13) 1(131.87,86.4) 1(131.87,86.66) 1(131.87,86.93) 1(131.87,121.2) 1(131.87,121.47) 1(131.87,122) 1(131.87,134.05) 1(131.87,134.59) 1(131.87,156.81) 1(131.87,157.07) 1(131.87,157.34) 1(131.87,157.61) 1(132.13,29.37) 1(132.13,29.91) 1(132.13,42.76) 1(132.13,77.29) 1(132.13,77.56) 1(132.13,77.83) 1(132.13,78.1) 1(132.13,78.36) 1(132.13,78.63) 1(132.13,78.9) 1(132.13,79.44) 1(132.13,79.7) 1(132.13,79.97) 1(132.13,80.24) 1(132.13,80.51) 1(132.13,80.77) 1(132.13,81.04) 1(132.13,81.31) 1(132.13,81.58) 1(132.13,81.85) 1(132.13,82.11) 1(132.13,82.38) 1(132.13,82.65) 1(132.13,82.92) 1(132.13,83.18) 1(132.13,83.45) 1(132.13,83.72) 1(132.13,83.99) 1(132.13,84.25) 1(132.13,84.52) 1(132.13,84.79) 1(132.13,85.33) 1(132.13,85.59) 1(132.13,85.86) 1(132.13,86.13) 1(132.13,86.4) 1(132.13,86.66) 1(132.13,86.93) 1(132.13,121.47) 1(132.13,121.74) 1(132.13,122.27) 1(132.13,134.32) 1(132.13,134.85) 1(132.4,41.96) 1(132.4,77.29) 1(132.4,77.56) 1(132.4,77.83) 1(132.4,78.1) 1(132.4,78.36) 1(132.4,78.63) 1(132.4,85.59) 1(132.4,85.86) 1(132.4,86.13) 1(132.4,86.4) 1(132.4,86.66) 1(132.4,121.74) 1(132.4,122) 1(132.4,122.54) 1(132.4,134.32) 1(132.4,157.07) 1(132.4,157.34) 1(132.67,6.35) 1(132.67,6.62) 1(132.67,6.88) 1(132.67,7.15) 1(132.67,29.11) 1(132.67,29.37) 1(132.67,29.64) 1(132.67,41.69) 1(132.67,42.49) 1(132.67,73.81) 1(132.67,74.35) 1(132.67,78.9) 1(132.67,85.33) 1(132.67,86.93) 1(132.67,89.88) 1(132.67,90.41) 1(132.67,122.27) 1(132.67,134.85) 1(132.67,135.12) 1(132.67,157.88) 1(132.94,41.42) 1(132.94,41.69) 1(132.94,41.96) 1(132.94,72.74) 1(132.94,73.01) 1(132.94,73.28) 1(132.94,73.81) 1(132.94,74.35) 1(132.94,75.69) 1(132.94,75.96) 1(132.94,76.22) 1(132.94,76.49) 1(132.94,76.76) 1(132.94,77.03) 1(132.94,87.2) 1(132.94,87.47) 1(132.94,87.74) 1(132.94,88) 1(132.94,88.27) 1(132.94,89.88) 1(132.94,90.41) 1(132.94,90.68) 1(132.94,90.95) 1(132.94,91.22) 1(132.94,91.48) 1(132.94,122) 1(132.94,122.27) 1(132.94,122.81) 1(132.94,134.59) 1(132.94,135.12) 1(132.94,135.39) 1(133.2,28.84) 1(133.2,29.37) 1(133.2,71.94) 1(133.2,72.21) 1(133.2,72.48) 1(133.2,72.74) 1(133.2,73.01) 1(133.2,73.28) 1(133.2,74.62) 1(133.2,74.88) 1(133.2,75.15) 1(133.2,75.42) 1(133.2,88.54) 1(133.2,88.81) 1(133.2,89.07) 1(133.2,89.34) 1(133.2,89.61) 1(133.2,90.68) 1(133.2,90.95) 1(133.2,91.22) 1(133.2,91.48) 1(133.2,91.75) 1(133.2,92.02) 1(133.2,92.29) 1(133.2,123.07) 1(133.2,134.85) 1(133.2,158.14) 1(133.47,6.08) 1(133.47,6.35) 1(133.47,6.62) 1(133.47,29.11) 1(133.47,41.15) 1(133.47,41.42) 1(133.47,41.69) 1(133.47,41.96) 1(133.47,71.4) 1(133.47,71.67) 1(133.47,71.94) 1(133.47,72.21) 1(133.47,72.48) 1(133.47,73.28) 1(133.47,73.55) 1(133.47,73.81) 1(133.47,74.08) 1(133.47,74.35) 1(133.47,89.88) 1(133.47,90.14) 1(133.47,90.41) 1(133.47,90.68) 1(133.47,90.95) 1(133.47,91.75) 1(133.47,92.02) 1(133.47,92.29) 1(133.47,92.55) 1(133.47,92.82) 1(133.47,135.39) 1(133.74,28.84) 1(133.74,40.88) 1(133.74,71.14) 1(133.74,71.94) 1(133.74,72.48) 1(133.74,72.74) 1(133.74,73.01) 1(133.74,91.22) 1(133.74,91.48) 1(133.74,91.75) 1(133.74,92.29) 1(133.74,93.09) 1(133.74,123.34) 1(134.01,28.3) 1(134.01,28.57) 1(134.01,29.11) 1(134.01,41.15) 1(134.01,41.42) 1(134.01,70.6) 1(134.01,70.87) 1(134.01,71.14) 1(134.01,71.4) 1(134.01,71.67) 1(134.01,72.21) 1(134.01,92.02) 1(134.01,92.55) 1(134.01,92.82) 1(134.01,93.36) 1(134.01,93.62) 1(134.01,123.07) 1(134.01,135.12) 1(134.27,6.35) 1(134.27,28.3) 1(134.27,28.57) 1(134.27,70.07) 1(134.27,70.33) 1(134.27,70.6) 1(134.27,71.14) 1(134.27,71.4) 1(134.27,71.67) 1(134.27,92.55) 1(134.27,92.82) 1(134.27,93.36) 1(134.27,93.89) 1(134.27,94.16) 1(134.27,123.61) 1(134.27,158.41) 1(134.54,5.81) 1(134.54,28.03) 1(134.54,28.3) 1(134.54,28.84) 1(134.54,40.35) 1(134.54,40.62) 1(134.54,41.15) 1(134.54,69.8) 1(134.54,70.07) 1(134.54,70.33) 1(134.54,70.6) 1(134.54,93.36) 1(134.54,93.89) 1(134.54,94.16) 1(134.54,94.43) 1(134.54,123.07) 1(134.54,135.39) 1(134.81,5.55) 1(134.81,28.3) 1(134.81,28.57) 1(134.81,40.08) 1(134.81,70.07) 1(134.81,70.33) 1(134.81,93.89) 1(134.81,94.16) 1(134.81,123.61) 1(134.81,123.88) 1(134.81,124.14) 1(134.81,135.66) 1(134.81,158.68) 1(135.08,5.28) 1(135.08,28.03) 1(135.08,68.46) 1(135.08,69.26) 1(135.08,94.96) 1(135.08,123.88) 1(135.08,158.14) 1(135.35,39.81) 1(135.35,67.66) 1(135.35,67.92) 1(135.35,68.19) 1(135.35,68.46) 1(135.35,69.53) 1(135.35,94.7) 1(135.35,96.03) 1(135.35,96.3) 1(135.35,96.57) 1(135.35,123.61) 1(135.35,124.14) 1(135.35,136.19) 1(135.61,28.3) 1(135.61,40.08) 1(135.61,67.39) 1(135.61,67.92) 1(135.61,68.19) 1(135.61,68.46) 1(135.61,68.73) 1(135.61,68.99) 1(135.61,95.23) 1(135.61,95.5) 1(135.61,96.03) 1(135.61,96.3) 1(135.61,96.84) 1(135.61,97.11) 1(135.61,123.88) 1(135.61,124.41) 1(135.61,135.92) 1(135.61,136.19) 1(135.61,136.46) 1(135.61,158.14) 1(135.88,66.85) 1(135.88,67.12) 1(135.88,67.39) 1(135.88,67.66) 1(135.88,67.92) 1(135.88,68.19) 1(135.88,95.77) 1(135.88,96.03) 1(135.88,96.84) 1(135.88,97.37) 1(135.88,158.41) 1(135.88,158.68) 1(135.88,158.95) 1(136.15,28.03) 1(136.15,39.55) 1(136.15,39.81) 1(136.15,40.08) 1(136.15,66.85) 1(136.15,67.12) 1(136.15,67.39) 1(136.15,67.66) 1(136.15,96.3) 1(136.15,96.84) 1(136.15,97.11) 1(136.15,97.64) 1(136.15,124.14) 1(136.15,124.41) 1(136.15,124.68) 1(136.15,136.19) 1(136.15,136.46) 1(136.15,136.73) 1(136.42,5.01) 1(136.42,27.5) 1(136.42,66.32) 1(136.42,66.59) 1(136.42,67.12) 1(136.42,97.91) 1(136.68,27.23) 1(136.68,27.5) 1(136.68,27.77) 1(136.68,39.55) 1(136.68,39.81) 1(136.68,65.78) 1(136.68,66.05) 1(136.68,66.32) 1(136.68,66.85) 1(136.68,97.11) 1(136.68,97.91) 1(136.68,98.18) 1(136.68,98.44) 1(136.68,124.41) 1(136.68,124.95) 1(136.68,136.46) 1(136.68,136.73) 1(136.68,136.99) 1(136.68,158.41) 1(136.68,158.95) 1(136.68,159.22) 1(136.95,26.96) 1(136.95,39.01) 1(136.95,65.78) 1(136.95,66.05) 1(136.95,66.32) 1(136.95,98.18) 1(136.95,125.22) 1(136.95,137.26) 1(136.95,158.68) 1(137.22,5.28) 1(137.22,38.74) 1(137.22,39.28) 1(137.22,39.55) 1(137.22,65.78) 1(137.22,66.05) 1(137.22,97.91) 1(137.22,98.18) 1(137.22,125.22) 1(137.22,125.48) 1(137.22,136.73) 1(137.49,27.5) 1(137.49,39.01) 1(137.49,39.28) 1(137.49,65.51) 1(137.49,125.22) 1(137.49,136.99) 1(137.49,137.26) 1(137.49,137.53) 1(137.49,159.48) 1(137.75,4.74) 1(137.75,5.28) 1(137.75,26.7) 1(137.75,26.96) 1(137.75,38.48) 1(137.75,39.28) 1(137.75,64.44) 1(137.75,98.71) 1(137.75,99.25) 1(137.75,99.78) 1(137.75,125.75) 1(137.75,136.99) 1(137.75,158.95) 1(137.75,159.22) 1(138.02,5.01) 1(138.02,38.74) 1(138.02,39.01) 1(138.02,63.91) 1(138.02,64.18) 1(138.02,65.25) 1(138.02,98.98) 1(138.02,99.51) 1(138.02,99.78) 1(138.02,100.05) 1(138.02,125.48) 1(138.29,26.43) 1(138.29,26.7) 1(138.29,26.96) 1(138.29,63.64) 1(138.29,64.18) 1(138.29,64.71) 1(138.29,64.98) 1(138.29,99.78) 1(138.29,100.05) 1(138.29,100.32) 1(138.29,100.59) 1(138.29,126.02) 1(138.29,137.53) 1(138.29,137.8) 1(138.56,38.21) 1(138.56,38.74) 1(138.56,63.11) 1(138.56,63.37) 1(138.56,63.91) 1(138.56,64.18) 1(138.56,100.05) 1(138.56,100.32) 1(138.56,100.59) 1(138.56,100.85) 1(138.56,101.12) 1(138.56,137.26) 1(138.83,4.48) 1(138.83,4.74) 1(138.83,5.01) 1(138.83,26.16) 1(138.83,26.43) 1(138.83,63.37) 1(138.83,63.64) 1(138.83,63.91) 1(138.83,100.32) 1(138.83,100.59) 1(138.83,100.85) 1(138.83,101.12) 1(138.83,125.48) 1(138.83,125.75) 1(138.83,137.8) 1(138.83,159.22) 1(138.83,159.48) 1(138.83,159.75) 1(139.09,4.48) 1(139.09,26.7) 1(139.09,37.94) 1(139.09,38.48) 1(139.09,62.84) 1(139.09,63.64) 1(139.09,100.85) 1(139.09,101.39) 1(139.09,126.29) 1(139.36,4.48) 1(139.36,37.67) 1(139.36,38.48) 1(139.36,62.84) 1(139.36,63.37) 1(139.36,101.12) 1(139.36,101.39) 1(139.36,101.66) 1(139.36,125.75) 1(139.36,126.02) 1(139.63,4.21) 1(139.63,25.89) 1(139.63,26.16) 1(139.63,62.84) 1(139.63,101.39) 1(139.63,101.66) 1(139.63,101.92) 1(139.63,126.29) 1(139.63,126.55) 1(139.63,137.53) 1(139.63,160.02) 1(139.9,3.94) 1(139.9,4.74) 1(139.9,25.62) 1(139.9,26.43) 1(139.9,37.94) 1(139.9,38.21) 1(139.9,62.03) 1(139.9,62.57) 1(139.9,101.66) 1(139.9,101.92) 1(139.9,102.19) 1(139.9,102.46) 1(139.9,126.02) 1(139.9,126.29) 1(139.9,126.55) 1(139.9,126.82) 1(139.9,159.48) 1(139.9,160.29) 1(140.16,4.21) 1(140.16,4.48) 1(140.16,37.4) 1(140.16,37.67) 1(140.16,37.94) 1(140.16,38.21) 1(140.16,61.5) 1(140.16,61.77) 1(140.16,62.03) 1(140.16,62.3) 1(140.16,101.92) 1(140.16,102.19) 1(140.16,126.29) 1(140.16,137.8) 1(140.43,25.62) 1(140.43,25.89) 1(140.43,61.77) 1(140.43,62.03) 1(140.43,102.19) 1(140.43,102.46) 1(140.43,102.73) 1(140.7,26.16) 1(140.7,37.14) 1(140.7,37.4) 1(140.7,60.96) 1(140.7,61.23) 1(140.7,61.5) 1(140.7,61.77) 1(140.7,102.46) 1(140.7,102.73) 1(140.7,102.99) 1(140.7,126.29) 1(140.7,126.55) 1(140.7,126.82) 1(140.97,4.48) 1(140.97,37.67) 1(140.97,60.7) 1(140.97,61.23) 1(140.97,61.5) 1(140.97,102.73) 1(140.97,102.99) 1(140.97,103.26) 1(140.97,127.09) 1(140.97,138.07) 1(140.97,160.55) 1(141.24,3.67) 1(141.24,3.94) 1(141.24,4.21) 1(141.24,25.89) 1(141.24,60.7) 1(141.24,60.96) 1(141.24,61.23) 1(141.24,102.99) 1(141.24,103.26) 1(141.24,138.33) 1(141.24,138.87) 1(141.5,36.87) 1(141.5,37.14) 1(141.5,37.4) 1(141.5,60.96) 1(141.5,103.26) 1(141.5,126.82) 1(141.5,127.09) 1(141.5,127.36) 1(141.77,60.7) 1(141.77,103.53) 1(141.77,104.07) 1(142.04,25.09) 1(142.04,25.62) 1(142.04,103.8) 1(142.04,104.07) 1(142.04,104.33) 1(142.04,127.09) 1(142.04,127.62) 1(142.04,138.6) 1(142.04,138.87) 1(142.04,139.14) 1(142.04,160.29) 1(142.31,3.4) 1(142.31,3.94) 1(142.31,36.33) 1(142.31,36.6) 1(142.31,36.87) 1(142.31,37.14) 1(142.31,59.89) 1(142.31,60.43) 1(142.31,127.89) 1(142.31,160.29) 1(142.31,160.82) 1(142.57,59.89) 1(142.57,60.16) 1(142.57,104.07) 1(142.57,104.33) 1(142.57,104.6) 1(142.84,36.07) 1(142.84,36.33) 1(142.84,36.6) 1(142.84,36.87) 1(142.84,104.6) 1(142.84,104.87) 1(142.84,128.16) 1(142.84,139.14) 1(142.84,139.4) 1(142.84,160.29) 1(143.11,24.82) 1(143.11,25.09) 1(143.11,36.33) 1(143.11,36.6) 1(143.11,59.62) 1(143.11,59.89) 1(143.11,104.33) 1(143.11,104.87) 1(143.11,138.87) 1(143.11,160.29) 1(143.38,25.36) 1(143.38,58.82) 1(143.38,59.09) 1(143.38,59.36) 1(143.38,104.6) 1(143.38,104.87) 1(143.38,160.55) 1(143.64,58.55) 1(143.64,59.09) 1(143.64,139.67) 1(143.64,161.09) 1(143.91,3.14) 1(143.91,24.55) 1(143.91,35.8) 1(143.91,58.82) 1(143.91,59.09) 1(143.91,105.14) 1(143.91,127.89) 1(143.91,128.43) 1(143.91,139.14) 1(143.91,139.4) 1(143.91,139.94) 1(143.91,161.09) 1(144.18,24.29) 1(144.18,24.82) 1(144.18,25.09) 1(144.18,58.55) 1(144.18,58.82) 1(144.18,127.89) 1(144.45,105.4) 1(144.45,105.94) 1(144.45,128.16) 1(144.72,35.53) 1(144.72,105.94) 1(144.72,160.55) 1(144.72,161.09) 1(144.98,2.87) 1(144.98,58.55) 1(144.98,105.67) 1(144.98,106.48) 1(144.98,128.16) 1(144.98,139.4) 1(144.98,139.67) 1(144.98,139.94) 1(144.98,160.82) 1(144.98,161.36) 1(145.25,24.02) 1(145.25,24.29) 1(145.25,24.55) 1(145.25,24.82) 1(145.25,58.02) 1(145.25,58.29) 1(145.25,105.94) 1(145.25,106.48) 1(145.25,106.74) 1(145.25,128.43) 1(145.25,128.7) 1(145.25,140.21) 1(145.52,24.55) 1(145.52,35.26) 1(145.52,35.8) 1(145.52,57.48) 1(145.52,106.21) 1(145.79,57.22) 1(145.79,57.48) 1(145.79,57.75) 1(145.79,106.74) 1(145.79,107.01) 1(146.05,24.02) 1(146.05,35.8) 1(146.05,106.48) 1(146.05,107.01) 1(146.05,107.28) 1(146.05,128.43) 1(146.05,128.7) 1(146.05,139.67) 1(146.05,140.21) 1(146.32,23.75) 1(146.32,24.29) 1(146.32,56.95) 1(146.32,57.22) 1(146.32,106.74) 1(146.32,129.23) 1(146.32,140.48) 1(146.32,160.82) 1(146.32,161.09) 1(146.32,161.36) 1(146.32,161.62) 1(146.59,2.6) 1(146.59,34.99) 1(146.59,35.53) 1(146.59,56.68) 1(146.59,57.22) 1(146.59,57.48) 1(146.86,2.87) 1(146.86,3.14) 1(146.86,56.41) 1(146.86,56.95) 1(146.86,107.01) 1(146.86,107.28) 1(146.86,140.48) 1(147.12,3.14) 1(147.12,34.73) 1(147.12,34.99) 1(147.12,35.53) 1(147.12,128.7) 1(147.12,129.23) 1(147.39,35.26) 1(147.39,56.14) 1(147.39,56.41) 1(147.39,56.95) 1(147.39,107.28) 1(147.39,129.5) 1(147.39,139.94) 1(147.66,3.14) 1(147.66,23.48) 1(147.66,23.75) 1(147.93,24.02) 1(147.93,55.88) 1(147.93,56.14) 1(147.93,107.55) 1(147.93,128.96) 1(147.93,161.09) 1(148.2,2.87) 1(148.2,3.14) 1(148.2,35.26) 1(148.2,56.41) 1(148.2,129.23) 1(148.2,129.5) 1(148.2,129.77) 1(148.2,161.36) 1(148.2,161.62) 1(148.2,161.89) 1(148.46,2.33) 1(148.46,2.6) 1(148.46,34.46) 1(148.46,34.73) 1(148.46,34.99) 1(148.46,55.88) 1(148.46,107.81) 